# Altium footprint library Toi Library.PcbLib: 740 footprints (part 13 of 47)
Each footprint in its own frame and in the unit in brackets; x right, y up, seen from the top. Pads: shape width x height; smd on the part's side, far side on the other; paste and mask are expansions set on the pad; w line width, h text height; cw(c..) or ccw(c..) is an arc to the next point about the centre after c.
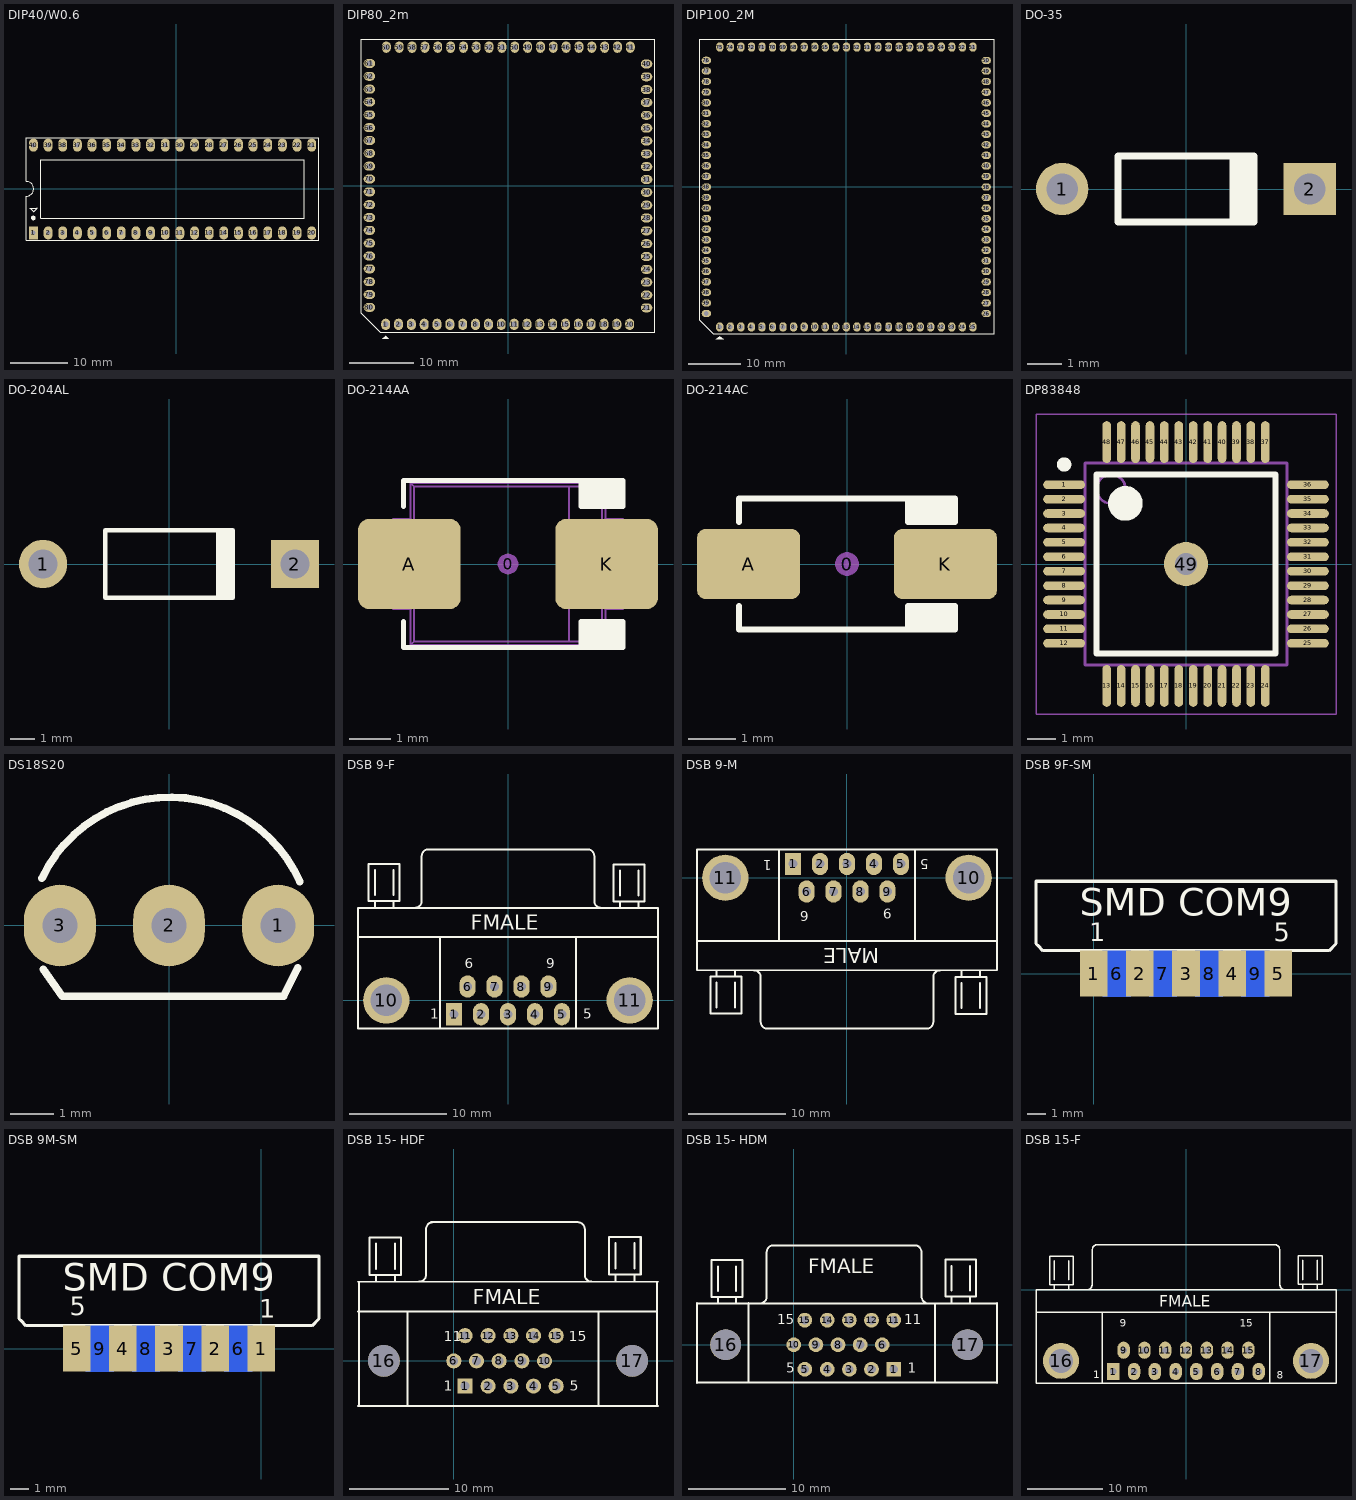
[diagram p12: the footprints below, top view; thin cyan lines are the x and y axes]

## DIP40/W0.6 [mil] "40 PIN, W 600mil, Pin to pin 100mil"
height 100
pads (40):
  rect 60x90 hole 31: 1(-975,-300)
  oval 60x90 hole 31: 2(-875,-300) 3(-775,-300) 4(-675,-300) 5(-575,-300) 6(-475,-300) 7(-375,-300) 8(-275,-300) 9(-175,-300) 10(-75,-300) 11(25,-300) 12(125,-300) 13(225,-300) 14(325,-300) 15(425,-300) 16(525,-300) 17(625,-300) 18(725,-300) 19(825,-300) 20(925,-300) 21(925,300) 22(825,300) 23(725,300) 24(625,300) 25(525,300) 26(425,300) 27(325,300) 28(225,300) 29(125,300) 30(25,300) 31(-75,300) 32(-175,300) 33(-275,300) 34(-375,300) 35(-475,300) 36(-575,300) 37(-675,300) 38(-775,300) 39(-875,300) 40(-975,300)
Top Overlay:
  circle w15: c-976,-198 r8
  lines w7: -1025.38,-48.95 ccw(c-1023.68,1.02) -1025,51 ; -1025,-49 -1025,-350 975,-350 975,350 -1025,350 -1025,52 ; -999,-130 -951,-130 -950,-129 -950,-131 -974,-155 -974,-154 -998,-130 -999,-130 ; -925,-200 -925,200 875,200 875,-200 -925,-200
3D body "SW3dPS-DIP40-600.STEP": height 224.41, standoff -101.57, extent -1057.48,-310 1007.48,299.84

## DIP80_2m [mil] "DIP80, P - P 200"
pads (80):
  oval 55x70 hole 35: 1(-750,-850) 2(-671.26,-850) 3(-592.52,-850) 4(-513.78,-850) 5(-435.04,-850) 6(-356.3,-850) 7(-277.56,-850) 8(-198.82,-850) 9(-120.08,-850) 10(-41.34,-850) 11(37.4,-850) 12(116.14,-850) 13(194.88,-850) 14(273.62,-850) 15(352.36,-850) 16(431.1,-850) 17(509.84,-850) 18(588.58,-850) 19(667.32,-850) 20(746.06,-850) 41(750,850) 42(671.26,850) 43(592.52,850) 44(513.78,850) 45(435.04,850) 46(356.3,850) 47(277.56,850) 48(198.82,850) 49(120.08,850) 50(41.34,850) 51(-37.4,850) 52(-116.14,850) 53(-194.88,850) 54(-273.62,850) 55(-352.36,850) 56(-431.1,850) 57(-509.84,850) 58(-588.58,850) 59(-667.32,850) 60(-746.06,850)
  oval 70x55 hole 35: 21(850,-749) 22(850,-670.26) 23(850,-591.52) 24(850,-512.78) 25(850,-434.04) 26(850,-355.3) 27(850,-276.56) 28(850,-197.82) 29(850,-119.08) 30(850,-40.34) 31(850,38.4) 32(850,117.14) 33(850,195.88) 34(850,274.62) 35(850,353.36) 36(850,432.1) 37(850,510.84) 38(850,589.58) 39(850,668.32) 40(850,747.06) 61(-850,750) 62(-850,671.26) 63(-850,592.52) 64(-850,513.78) 65(-850,435.04) 66(-850,356.3) 67(-850,277.56) 68(-850,198.82) 69(-850,120.08) 70(-850,41.34) 71(-850,-37.4) 72(-850,-116.14) 73(-850,-194.88) 74(-850,-273.62) 75(-850,-352.36) 76(-850,-431.1) 77(-850,-509.84) 78(-850,-588.58) 79(-850,-667.32) 80(-850,-746.06)
Top Overlay:
  region: -770,-940 -750,-920 -730,-940
  lines w7: -900,-783 -900,900 900,900 900,-900 -783,-900 -900,-783

## DIP100_2M [mil] "DIP100 - P-P 2mm"
pads (100):
  oval 55x70 hole 35: 1(-945,-1045) 2(-866.26,-1045) 3(-787.52,-1045) 4(-708.78,-1045) 5(-630.04,-1045) 6(-551.3,-1045) 7(-472.56,-1045) 8(-393.82,-1045) 9(-315.08,-1045) 10(-236.34,-1045) 11(-157.6,-1045) 12(-78.86,-1045) 13(-0.12,-1045) 14(78.62,-1045) 15(157.36,-1045) 16(236.1,-1045) 17(314.84,-1045) 18(393.58,-1045) 19(472.32,-1045) 20(551.06,-1045) 21(629.8,-1045) 22(708.54,-1045) 23(787.28,-1045) 24(866.02,-1045) 25(944.76,-1045) 51(945,1045) 52(866.26,1045) 53(787.52,1045) 54(708.78,1045) 55(630.04,1045) 56(551.3,1045) 57(472.56,1045) 58(393.82,1045) 59(315.08,1045) 60(236.34,1045) 61(157.6,1045) 62(78.86,1045) 63(0.12,1045) 64(-78.62,1045) 65(-157.36,1045) 66(-236.1,1045) 67(-314.84,1045) 68(-393.58,1045) 69(-472.32,1045) 70(-551.06,1045) 71(-629.8,1045) 72(-708.54,1045) 73(-787.28,1045) 74(-866.02,1045) 75(-944.76,1045)
  oval 70x55 hole 35: 26(1045,-945) 27(1045,-866.26) 28(1045,-787.52) 29(1045,-708.78) 30(1045,-630.04) 31(1045,-551.3) 32(1045,-472.56) 33(1045,-393.82) 34(1045,-315.08) 35(1045,-236.34) 36(1045,-157.6) 37(1045,-78.86) 38(1045,-0.12) 39(1045,78.62) 40(1045,157.36) 41(1045,236.1) 42(1045,314.84) 43(1045,393.58) 44(1045,472.32) 45(1045,551.06) 46(1045,629.8) 47(1045,708.54) 48(1045,787.28) 49(1045,866.02) 50(1045,944.76) 76(-1045,945) 77(-1045,866.26) 78(-1045,787.52) 79(-1045,708.78) 80(-1045,630.04) 81(-1045,551.3) 82(-1045,472.56) 83(-1045,393.82) 84(-1045,315.08) 85(-1045,236.34) 86(-1045,157.6) 87(-1045,78.86) 88(-1045,0.12) 89(-1045,-78.62) 90(-1045,-157.36) 91(-1045,-236.1) 92(-1045,-314.84) 93(-1045,-393.58) 94(-1045,-472.32) 95(-1045,-551.06) 96(-1045,-629.8) 97(-1045,-708.54) 98(-1045,-787.28) 99(-1045,-866.02) 100(-1045,-944.76)
Top Overlay:
  region: -945,-1115 -975,-1135 -915,-1135
  lines w7: -1095,-995 -995,-1095 1105,-1095 1105,1105 -1095,1105 -1095,-995

## DO-35 [mm] "Diode, Axial; Body 3.8 x 1.9 mm (LxDia. max), Lead Dia. 0.53 mm (max)"
height 1.9
pads (2):
  round 1.5 hole 0.9: 1(-3.55,0)
  rect 1.5x1.5 hole 0.9: 2(3.55,0)
Top Overlay:
  rectangle: 1.25,-0.95 2.05,0.95
  lines w0.2: 1.95,-0.95 -1.95,-0.95 -1.95,0.95 1.95,0.95
3D body "User Library-DO-35_300mils.STEP": height 2.46, standoff -2, extent -4.07,-0.965 4.07,0.955

## DO-204AL [mm] "Diode, Axial; Body 5.2 x 2.7 mm (LxDia. max), Lead Dia. 0.86 mm (max)"
height 2.7
pads (2):
  round 2 hole 1.2: 1(-5.23,0)
  rect 2x2 hole 1.2: 2(5.23,0)
Top Overlay:
  rectangle: 1.95,-1.4 2.75,1.4
  lines w0.2: 2.65,-1.4 -2.65,-1.4 -2.65,1.4 2.65,1.4
3D body "User Library-Fast Silicon Rectifier Diodes BY296 DIOTEC (pcb).STEP": height 4.8, standoff -3.31, extent -5.68,-2.286 5.68,2.234

## DO-214AA [mm] "JEDEC DO214 variation AA. SMB"
height 2.65
pads (3):
  round 0.508 on Mech15: 0(0,0)
  rrect25% 2.5x2.2 smd: A(-2.4,0) K(2.4,0)
Top Overlay:
  region: 1.778,1.397 1.778,2.032 2.794,2.032 2.794,1.397
  region: 1.778,-1.397 1.778,-2.032 2.794,-2.032 2.794,-1.397
  lines w0.127: -2.54,-1.397 -2.54,-2.032 1.778,-2.032 ; -2.54,1.397 -2.54,2.032 1.778,2.032 ; 1.778,-2.032 1.778,-1.397 2.794,-1.397 2.794,-2.032 1.778,-2.032 ; 1.778,2.032 2.794,2.032 2.794,1.397 1.778,1.397 1.778,2.032
Mechanical 13:
  lines w0.05: -2.375,-1.1 -2.375,-1.973 ; -2.375,1.1 -2.375,1.973 ; 2.375,-1.1 2.375,-1.973 ; 2.375,1.1 2.375,1.973 ; -2.375,-1.973 -2.373,-1.975 2.373,-1.975 2.375,-1.973 ; -2.375,-1.973 -2.285,-1.883 ; -2.375,1.973 -2.373,1.975 2.373,1.975 2.375,1.973 ; -2.375,1.973 -2.285,1.883 ; -2.285,-1.883 1.485,-1.884 ; -2.285,-1.883 -2.285,1.883 ; -2.285,1.883 1.485,1.884 ; 1.485,-1.884 2.285,-1.884 ; 1.485,-1.884 1.485,1.884 ; 1.485,1.884 2.285,1.884 ; 2.285,-1.884 2.285,1.884 ; 2.285,-1.884 2.375,-1.973 ; 2.285,1.884 2.375,1.973 ; -2.8,-1.1 -2.356,-1.1 -2.356,1.1 -2.8,1.1 -2.8,-1.1 ; 2.356,-1.1 2.8,-1.1 2.8,1.1 2.356,1.1 2.356,-1.1
3D body "DO-214AA.STEP": height 2.62, standoff 0, extent -2.8,-1.975 2.8,1.975

## DO-214AC [mm] "JEDEC DO214 variation AC. SMA"
height 2.5
pads (3):
  round 0.508 on Mech15: 0(0,0)
  rrect25% 2.2x1.5 smd: A(-2.1,0) K(2.1,0)
Top Overlay:
  rectangle: 1.3,0.9 2.3,1.4
  rectangle: 1.3,-1.4 2.3,-0.9
  lines w0.127: -2.3,-0.9 -2.3,-1.4 2.3,-1.4 2.3,-0.9 1.3,-0.9 1.3,-1.4 ; -2.3,0.9 -2.3,1.4 2.3,1.4 2.3,0.9 1.3,0.9 ; 1.3,0.911 1.3,1.4
3D body "SS14-DO-214AC_SMA.STEP": height -1.22, standoff -3.42, extent -2.5,-1.35 2.5,1.35

## DP83848 [mm]
height 1.6
pads (49):
  oval 1.45x0.3 smd: 1(-4.225,2.75) 2(-4.225,2.25) 3(-4.225,1.75) 4(-4.225,1.25) 5(-4.225,0.75) 6(-4.225,0.25) 7(-4.225,-0.25) 8(-4.225,-0.75) 9(-4.225,-1.25) 10(-4.225,-1.75) 11(-4.225,-2.25) 12(-4.225,-2.75) 25(4.225,-2.75) 26(4.225,-2.25) 27(4.225,-1.75) 28(4.225,-1.25) 29(4.225,-0.75) 30(4.225,-0.25) 31(4.225,0.25) 32(4.225,0.75) 33(4.225,1.25) 34(4.225,1.75) 35(4.225,2.25) 36(4.225,2.75)
  oval 0.3x1.45 smd: 13(-2.75,-4.225) 14(-2.25,-4.225) 15(-1.75,-4.225) 16(-1.25,-4.225) 17(-0.75,-4.225) 18(-0.25,-4.225) 19(0.25,-4.225) 20(0.75,-4.225) 21(1.25,-4.225) 22(1.75,-4.225) 23(2.25,-4.225) 24(2.75,-4.225) 37(2.75,4.225) 38(2.25,4.225) 39(1.75,4.225) 40(1.25,4.225) 41(0.75,4.225) 42(0.25,4.225) 43(-0.25,4.225) 44(-0.75,4.225) 45(-1.25,4.225) 46(-1.75,4.225) 47(-2.25,4.225) 48(-2.75,4.225)
  round 1.524 hole 0.762: 49(0,0)
Top Overlay:
  circle w0.6: c-2.1,2.1 r0.3
  circle w0.25: c-4.225,3.45 r0.125
  lines w0.2: -3.1,-3.1 3.1,-3.1 3.1,3.1 -3.1,3.1 -3.1,-3.1
Mechanical 13:
  circle w0.1: c-2.6,2.6 r0.5
  lines w0.1: -3.5,-3.5 3.5,-3.5 3.5,3.5 -3.5,3.5 -3.5,-3.5
Mechanical 15:
  lines w0.05: -5.2,-5.2 5.2,-5.2 5.2,5.2 -5.2,5.2 -5.2,-5.2
  lines w0.1: -0.5,0 0.5,0 ; 0,-0.5 0,0.5
3D body "STM32F103C8T62.step": height 1.6, standoff 0, extent -4.5,-4.5 4.5,4.5

## DS18S20 [mil] "TO-92"
height 200
pads (3):
  oval 66x75 hole 32: 1(100,0) 2(0,0) 3(-100,0)
Top Overlay:
  lines w7: -116.52,43.21 cw(c0.97,-12.43) 119.94,39.97 ; -115.34,-40.24 -98,-65 105,-65 118,-39
3D body "SW3dPS-TO92.STEP": height 385.04, standoff -59.79, extent -108.88,-66.06 108.85,95.35

## DSB 9-F [mil] "COM FMALE - D Subminiature; 9 Position; Right Angle; Pitch 1.385 mm"
height 501.97
pads (11):
  rect 65x90 hole 35: 1(-218.11,-55.91)
  oval 65x90 hole 35: 2(-109.06,-55.91) 3(0,-55.91) 4(109.06,-55.91) 5(218.11,-55.91) 6(-163.58,55.91) 7(-54.53,55.91) 8(54.53,55.91) 9(163.58,55.91)
  round 187.4 hole 128.35: 10(-491.93,0) 11(491.93,0)
Top Overlay:
  lines w7.87: -606.3,255.91 606.3,255.91 ; -376.38,374.21 ccw(c-376.38,401.57) -349.02,401.57 -349.02,582.68 ; -348.82,582.87 cw(c-321.46,582.87) -321.46,610.24 321.46,610.24 cw(c321.46,582.87) 348.82,582.87 ; -275.59,-114.17 -275.59,255.91 ; 275.59,-114.17 275.59,255.91 ; 349.02,582.68 349.02,401.57 ccw(c376.38,401.57) 376.38,374.21 ; -606.3,-114.17 606.3,-114.17 606.3,374.02 -606.3,374.02 -606.3,-114.17
  lines w8: -538,376.02 -538,401.02 ; -538,426.02 -538,526.02 ; -463,376.02 -463,401.02 ; -463,426.02 -463,526.02 ; 452,374.02 452,399.02 ; 452,424.02 452,524.02 ; 527,374.02 527,399.02 ; 527,424.02 527,524.02 ; -563,401.02 -563,551.02 -438,551.02 -438,401.02 -563,401.02 ; 427,399.02 427,549.02 552,549.02 552,399.02 427,399.02
  text "FMALE" at -150,285 h60
  text "6" at -175,130 h40
  text "9" at 155,130 h40
  text "5" at 305,-75 h40
  text "1" at -315,-75 h40
3D body "SW3dPS-9-PIN_DSUB-1.STEP": height 531.94, standoff -87.06, extent -606.5,-130 606.5,621

## DSB 9-M [mil] "COM MALE D Subminiature; 9 Position; Right Angle; Pitch 1.385 mm"
height 501.97
pads (11):
  rect 65x90 hole 35: 1(-218.11,55.91)
  oval 65x90 hole 35: 2(-109.05,55.91) 3(0,55.91) 4(109.06,55.91) 5(218.11,55.91) 6(-163.58,-55.91) 7(-54.53,-55.91) 8(54.53,-55.91) 9(163.58,-55.91)
  round 187.4 hole 128.35: 10(491.93,0) 11(-491.93,0)
Top Overlay:
  lines w7.87: -606.3,-255.91 606.3,-255.91 ; -376.38,-374.21 cw(c-376.38,-401.57) -349.02,-401.57 -349.02,-582.68 ; -348.82,-582.87 ccw(c-321.46,-582.87) -321.46,-610.24 321.46,-610.24 ccw(c321.46,-582.87) 348.82,-582.87 ; -275.59,-255.91 -275.59,114.17 ; 275.59,-255.91 275.59,114.17 ; 349.02,-582.68 349.02,-401.57 cw(c376.38,-401.57) 376.38,-374.21 ; -606.3,-374.02 -606.3,114.17 606.3,114.17 606.3,-374.02 -606.3,-374.02
  lines w8: -527,-524.02 -527,-424.02 ; -527,-399.02 -527,-374.02 ; -452,-524.02 -452,-424.02 ; -452,-399.02 -452,-374.02 ; 463,-526.02 463,-426.02 ; 463,-401.02 463,-376.02 ; 538,-526.02 538,-426.02 ; 538,-401.02 538,-376.02 ; -552,-549.02 -552,-399.02 -427,-399.02 -427,-549.02 -552,-549.02 ; 438,-551.02 438,-401.02 563,-401.02 563,-551.02 438,-551.02
  text "MALE" at 130,-285 h60
  text "1" at -305,70 h40
  text "5" at 330,75 h40
  text "9" at 180,-125 h40
  text "6" at -155,-135 h40
3D body "SW3dPS-9-PIN_DSUB.STEP": height 473.04, standoff -145.96, extent -606,-637.5 610,137.5

## DSB 9F-SM [mil] "Com 9 chan SMD,F"
pads (11):
  rect 60x100 smd: 1(0,0) 2(100,0) 3(200,0) 4(300,0) 5(400,0)
  rect 60x100 smd far side: 6(50,0) 7(150,0) 8(250,0) 9(350,0)
  round 1 all layers, no hole: 10(21,144) 11(152,144)
Top Overlay:
  lines w7: -125,65 -125,100 -125,200 525,200 525,65 510,50 435,50 -110,50 -120,60 -125,65
  text "1" at -10,70 h40
  text "5" at 390,70 h40
  text "SMD COM9" at -30,125 h60
3D body "D-Sub-K122439082-Stig-Wahlstrom.step": height 246.06, standoff -277.56, extent -406.5,-135.04 806.5,305

## DSB 9M-SM [mil] "Com 9 chan SMD,F"
pads (11):
  rect 60x100 smd: 1(0,0) 2(-100,0) 3(-200,0) 4(-300,0) 5(-400,0)
  rect 60x100 smd far side: 6(-50,0) 7(-150,0) 8(-250,0) 9(-350,0)
  round 1 all layers, no hole: 10(-379,144) 11(-248,144)
Top Overlay:
  lines w7: -525,65 -525,100 -525,200 125,200 125,65 110,50 35,50 -510,50 -520,60 -525,65
  text "1" at -4,67 h40
  text "5" at -415,72 h40
  text "SMD COM9" at -430,125 h60
3D body "D-Sub-K122439084-Stig-Wahlstrom.step": height 246.06, standoff -277.56, extent -815.5,-125.04 397.5,315

## DSB 15- HDF [mil] "COM FMALE - D Subminiature; 15 Position; Right Angle; Pitch 1.385 mm"
height 501.97
pads (17):
  rect 60x60 hole 35: 1(45,-100)
  round 60 hole 35: 2(136.3,-100) 3(226.3,-100) 4(316.3,-100) 5(406.3,-100) 6(0,0) 7(90,0) 8(180,0) 9(270,0) 10(360,0) 11(45,100) 12(136.3,100) 13(226.3,100) 14(316.3,100) 15(406.3,100)
  round 125.98 hole 125.2: 16(-277.17,0) 17(707.09,0)
Top Overlay:
  lines w7.87: -380,-178.13 810,-178.13 ; -380,195.89 800,195.89 ; -380,314 810,314 ; -375.5,-178.13 -375.5,314 ; -184.17,-178.13 -184.17,195.89 ; -137.59,314.2 ccw(c-137.59,341.56) -110.23,341.56 -110.23,522.66 ; -110.03,522.86 cw(c-82.67,522.86) -82.67,550.22 ; -90,550.22 490,550.22 ; 492.13,550.22 cw(c492.13,522.86) 519.5,522.86 ; 519.69,522.66 519.69,341.56 ccw(c547.05,341.56) 547.05,314.2 ; 574.89,-178.13 574.89,195.89 ; 805.6,-178.13 805.6,314
  lines w8: -309.1,315 -309.1,340 ; -309.1,365 -309.1,465 ; -234.1,315 -234.1,340 ; -234.1,365 -234.1,465 ; 641.57,317 641.57,342 ; 641.57,367 641.57,467 ; 716.57,317 716.57,342 ; 716.57,367 716.57,467 ; -334.1,340 -209.1,340 -209.1,490 -334.1,490 -334.1,340 ; 616.57,342 741.57,342 741.57,492 616.57,492 616.57,342
  text "FMALE" at 75.05,224 h60
  text "11" at -39.37,78.74 h40
  text "15" at 456.69,78.74 h40
  text "5" at 460.63,-118.11 h40
  text "1" at -39.37,-118.11 h40

## DSB 15- HDM [mil] "COM FMALE - D Subminiature; 15 Position; Right Angle; Pitch 1.385 mm"
height 501.97
pads (17):
  rect 60x60 hole 35: 1(406.3,-100)
  round 60 hole 35: 2(316.3,-100) 3(226.3,-100) 4(136.3,-100) 5(45,-100) 6(360,0) 7(270,0) 8(180,0) 9(90,0) 10(0,0) 11(406.3,100) 12(316.3,100) 13(226.3,100) 14(136.3,100) 15(45,100)
  round 125.98 hole 125.2: 16(-277.17,0) 17(707.09,0)
Top Overlay:
  lines w7.87: -393.7,-154.5 826.77,-154.5 ; -393.7,168.33 826.77,168.33 ; -184.17,-153.54 -184.17,169.29 ; -137.59,168.53 ccw(c-137.59,195.89) -110.23,195.89 -110.23,376.99 ; -110.03,377.19 cw(c-82.67,377.19) -82.67,404.55 ; -90,404.55 490,404.55 ; 492.13,404.55 cw(c492.13,377.19) 519.5,377.19 ; 519.69,376.99 519.69,195.89 ccw(c547.05,195.89) 547.05,168.53 ; 574.89,-153.54 574.89,168.33
  lines w8: -309.1,169.33 -309.1,194.33 ; -309.1,219.33 -309.1,319.33 ; -234.1,169.33 -234.1,194.33 ; -234.1,219.33 -234.1,319.33 ; 641.57,171.33 641.57,196.33 ; 641.57,221.33 641.57,321.33 ; 716.57,171.33 716.57,196.33 ; 716.57,221.33 716.57,321.33 ; -334.1,194.33 -209.1,194.33 -209.1,344.33 -334.1,344.33 -334.1,194.33 ; 616.57,196.33 741.57,196.33 741.57,346.33 616.57,346.33 616.57,196.33
  lines w10: -393.7,-154.5 -393.7,168.33 ; 826.77,-154.5 826.77,168.33
  text "FMALE" at 59.06,291.34 h60
  text "11" at 448.82,82.68 h40
  text "15" at -66.93,82.68 h40
  text "5" at -31.5,-114.17 h40
  text "1" at 464.57,-114.17 h40
3D body "SW3dPS-SLIM D-SUB RIGHT ANGLE PCB MOUNT.STEP": height 403.54, standoff -121.72, extent -389.76,-125.98 822.83,404.33

## DSB 15-F [mil] "COM FMALE - D Subminiature; 15 Position; Right Angle; Pitch 1.385 mm"
height 501.97
pads (17):
  rect 65x90 hole 35: 1(-381.69,-429.92)
  oval 65x90 hole 35: 2(-272.64,-429.92) 3(-163.58,-429.92) 4(-54.53,-429.92) 5(54.53,-429.92) 6(163.58,-429.92) 7(272.64,-429.92) 8(381.69,-429.92) 9(-327.17,-318.11) 10(-218.11,-318.11) 11(-109.06,-318.11) 12(0,-318.11) 13(109.06,-318.11) 14(218.11,-318.11) 15(327.17,-318.11)
  round 188.98 hole 125.2: 16(-655.91,-374.02) 17(655.91,-374.02)
Top Overlay:
  lines w7.87: -787.4,-118.11 787.4,-118.11 ; -519.49,0.2 ccw(c-519.49,27.56) -492.13,27.56 -492.13,208.66 ; -491.93,208.86 cw(c-464.57,208.86) -464.57,236.22 464.57,236.22 cw(c464.57,208.86) 491.93,208.86 ; -438.58,-492.13 -438.58,-118.11 ; 438.58,-492.13 438.58,-118.11 ; 492.13,208.66 492.13,27.56 ccw(c519.49,27.56) 519.49,0.2 ; -787.4,-492.13 -787.4,0 787.4,0 787.4,-492.13 -787.4,-492.13
  lines w8: -691,1 -691,26 ; -691,51 -691,151 ; -616,1 -616,26 ; -616,51 -616,151 ; 614,3 614,28 ; 614,53 614,153 ; 689,3 689,28 ; 689,53 689,153 ; -716,26 -716,176 -591,176 -591,26 -716,26 ; 589,28 589,178 714,178 714,28 589,28
  text "1" at -488,-466 h40
  text "8" at 476,-469 h40
  text "15" at 282.87,-195.87 h40
  text "9" at -346.85,-195.87 h40
  text "FMALE" at -140,-90 h60
3D body "SW3DPS-DB15RA_F-DEFAULT.STEP": height 494.7, standoff -137.19, extent -778.92,-485.41 780.92,239